# Altium footprint library Opencore_PCB_Lib.PcbLib: 39 footprints (part 1 of 3)
Each footprint in its own frame and in the unit in brackets; x right, y up, seen from the top. Pads: shape width x height; smd on the part's side, far side on the other; paste and mask are expansions set on the pad; w line width, h text height; cw(c..) or ccw(c..) is an arc to the next point about the centre after c.
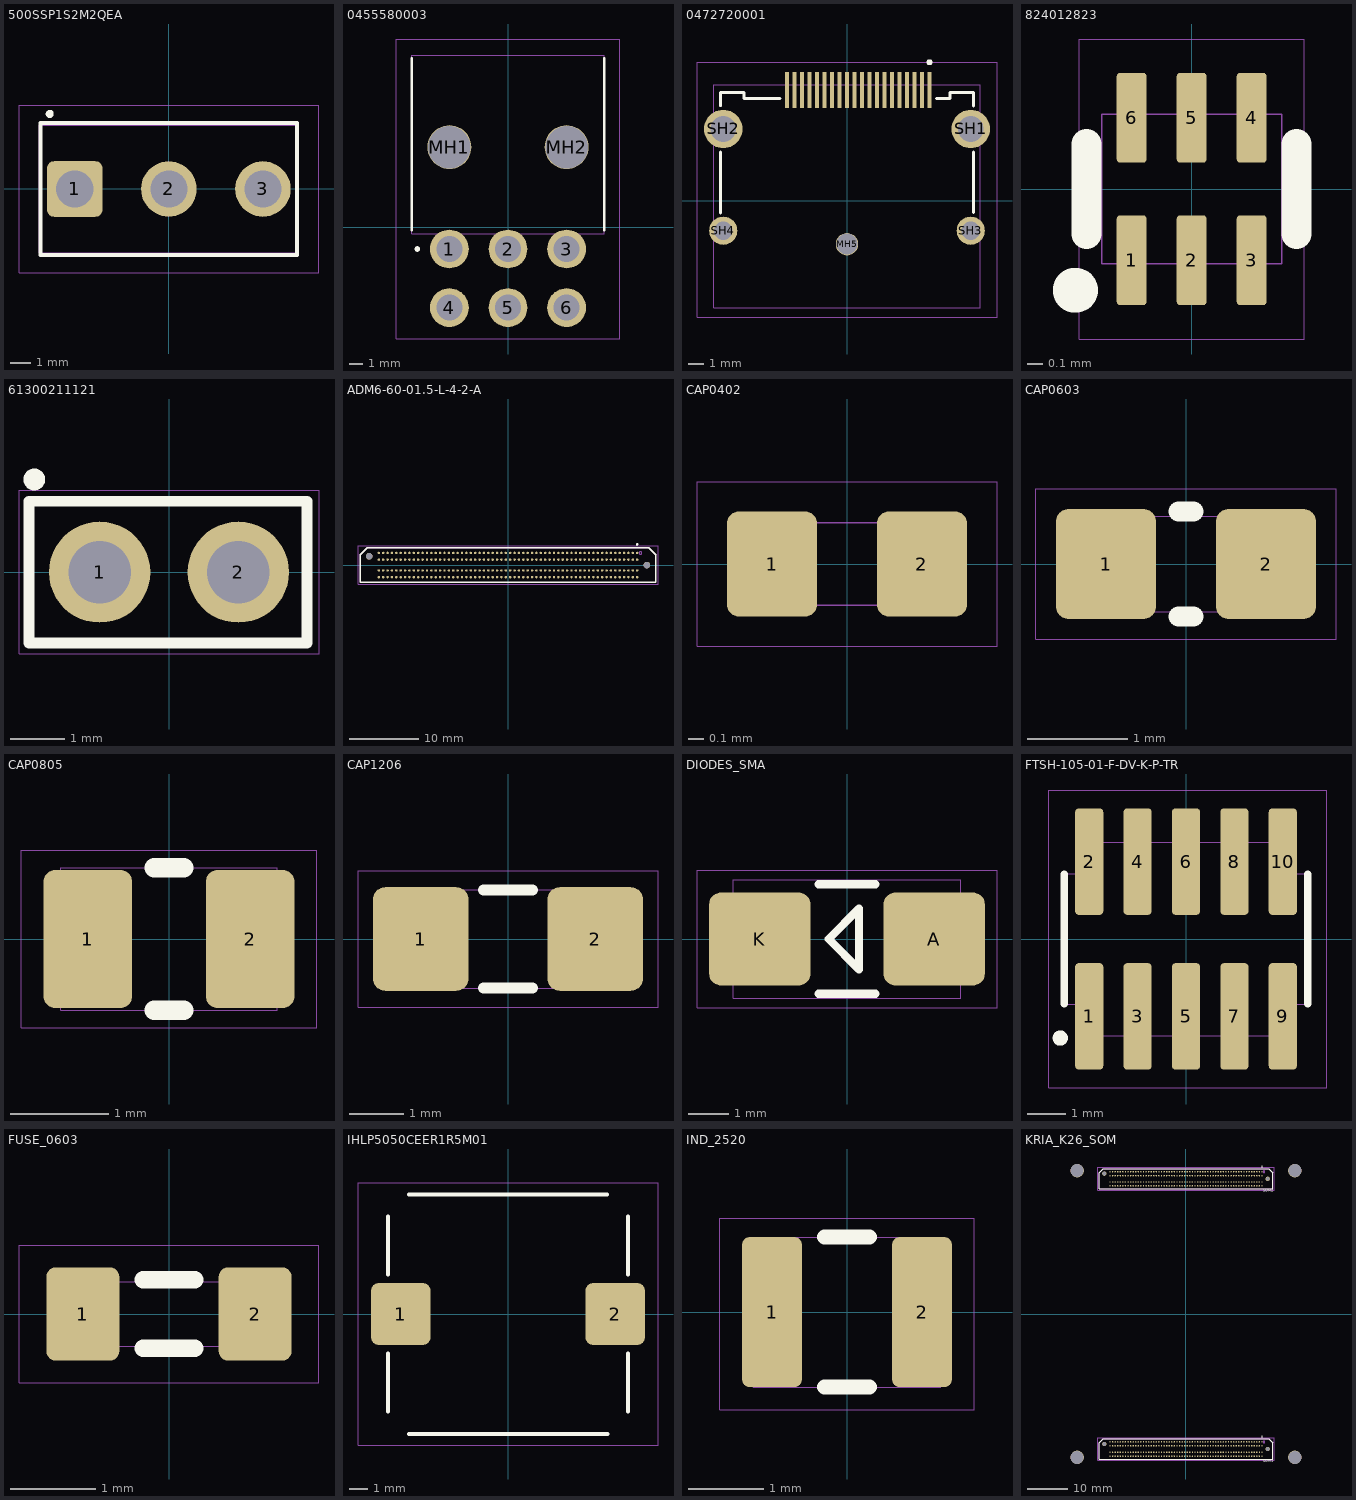
[diagram p0: the footprints below, top view; thin cyan lines are the x and y axes]

## 500SSP1S2M2QEA [mm]
pads (3):
  rrect25% 2.775x2.775 hole 1.85: 1(-4.7,0)
  round 2.775 hole 1.85: 2(0,0) 3(4.7,0)
Top Overlay:
  circle w0.2: c-5.95,3.75 r0.1
  lines w0.2: -6.4,-3.3 -6.4,3.3 6.4,3.3 6.4,-3.3 -6.4,-3.3
Top Component Outline:
  lines w0.01: -6.485,-3.175 6.485,-3.175 6.485,3.175 -6.485,3.175 -6.485,-3.175
Top Designator (Mech11):
  text ".Designator" at -3.647,-0.357 h1
Top Courtyard:
  lines w0.001: -7.485,-4.175 -7.485,4.175 7.5,4.175 7.5,-4.175 -7.485,-4.175
3D body "500SSP1S2M2QEA.stp": height 16.19, standoff -4, extent -6.34,-3.3 6.36,3.3

## 0455580003 [mm]
pads (8):
  round 2.775 hole 1.85: 1(-4.2,-1.55) 2(0,-1.55) 3(4.2,-1.55) 4(-4.2,-5.75) 5(0,-5.75) 6(4.2,-5.75)
  round 3.15 hole 3.05 unplated: MH1(-4.2,5.75) MH2(4.2,5.75)
Top Overlay:
  circle w0.2: c-6.5,-1.55 r0.1
  lines w0.2: -6.9,-0.2 -6.9,12.1 ; 6.9,-0.2 6.9,12.1
Top Component Outline:
  lines w0.01: -6.9,-0.45 6.9,-0.45 6.9,12.35 -6.9,12.35 -6.9,-0.45
Top Designator (Mech11):
  text ".Designator" at -3.647,-0.357 h1
Top Courtyard:
  lines w0.001: -8,-8 -8,13.5 8,13.5 8,-8 -8,-8
3D body "0455580003.stp": height 10.1, standoff -5, extent -6.9,-6.569 6.9,12.35

## 0472720001 [mm]
pads (25):
  rrect25% 0.28x2.4 smd mask+0.05: 1(5.5,7.4) 2(5,7.4) 3(4.5,7.4) 4(4,7.4) 5(3.5,7.4) 6(3,7.4) 7(2.5,7.4) 8(2,7.4) 9(1.5,7.4) 10(1,7.4) 11(0.5,7.4) 12(0,7.4) 13(-0.5,7.4) 14(-1,7.4) 15(-1.5,7.4) 16(-2,7.4) 17(-2.5,7.4) 18(-3,7.4) 19(-3.5,7.4) 20(-4,7.4)
  round 1.5 hole 1.4 unplated: MH5(0,-2.88)
  round 2.565 hole 1.71: SH1(8.25,4.8) SH2(-8.25,4.8)
  round 1.875 hole 1.25: SH3(8.25,-1.98) SH4(-8.25,-1.98)
Top Overlay:
  circle w0.2: c5.5,9.25 r0.1
  lines w0.2: -8.425,-0.8 -8.425,3.25 ; -8.425,6.35 -8.425,7.225 -6.875,7.225 -6.875,6.85 -4.45,6.85 ; 5.95,6.837 6.875,6.837 6.875,7.225 8.431,7.225 8.431,6.337 ; 8.425,-0.775 8.425,3.275
Top Component Outline:
  lines w0.01: -8.9,-7.13 -8.9,7.761 8.888,7.761 8.888,-7.13 -8.9,-7.13
Top Designator (Mech11):
  text ".Designator" at -3.647,-0.382 h1
Top Courtyard:
  lines w0.001: -10,-7.75 -10,9.25 10,9.25 10,-7.75 -10,-7.75
3D body "0472720001.stp": height 6.63, standoff -2.12, extent -8.895,-7.13 8.89,7.76

## 824012823 [mm]
pads (6):
  rrect25% 0.2x0.6 smd mask+0.05: 1(-0.4,-0.475) 2(0,-0.475) 3(0.4,-0.475) 4(0.4,0.475) 5(0,0.475) 6(-0.4,0.475)
Top Overlay:
  circle w0.2: c-0.775,-0.675 r0.05
  lines w0.2: -0.7,-0.3 -0.7,0.3 ; 0.7,-0.3 0.7,0.3
Top Component Outline:
  lines w0.01: -0.6,-0.5 -0.6,0.5 0.6,0.5 0.6,-0.5 -0.6,-0.5
Top Designator (Mech11):
  text ".Designator" at 0.107,-1.094 h0.3
Top Courtyard:
  lines w0.001: -0.75,-1 0.75,-1 0.75,1 -0.75,1 -0.75,-1
3D body "824012823.stp": height 0.45, standoff 0, extent -0.6,-0.5 0.6,0.5

## 61300211121 [mm] "CONN HEADER VERT 2POS 2.54MM"
pads (2):
  oval 1.86x1.85 hole 1.15: 1(-1.27,0) 2(1.27,0)
Top Overlay:
  circle w0.2: c-2.47,1.7 r0.1
  lines w0.2: -2.57,-1.3 2.53,-1.3 2.53,1.3 -2.57,1.3 -2.57,-1.3
Top Designator (Mech11):
  text ".Designator" at -2.735,-0.268 h0.75
Top Courtyard:
  lines w0.01: -2.75,-1.5 -2.75,1.5 2.75,1.5 2.75,-1.5 -2.75,-1.5
3D body "Wurth_61300211121.stp": height 8.55, standoff -2.99, extent -2.54,-1.27 2.54,1.27

## ADM6-60-01.5-L-4-2-A [mm] "SAMTEC CONN 0.635MM HDR 60POS SMD"
height 4.1
pads (242):
  round 0.356 smd: A1(18.733,1.75) A2(18.098,1.75) A3(17.463,1.75) A4(16.828,1.75) A5(16.193,1.75) A6(15.558,1.75) A7(14.923,1.75) A8(14.288,1.75) A9(13.653,1.75) A10(13.018,1.75) A11(12.383,1.75) A12(11.748,1.75) A13(11.113,1.75) A14(10.478,1.75) A15(9.843,1.75) A16(9.208,1.75) A17(8.573,1.75) A18(7.938,1.75) A19(7.303,1.75) A20(6.668,1.75) A21(6.033,1.75) A22(5.398,1.75) A23(4.763,1.75) A24(4.128,1.75) A25(3.493,1.75) A26(2.858,1.75) A27(2.223,1.75) A28(1.588,1.75) A29(0.953,1.75) A30(0.318,1.75) A31(-0.317,1.75) A32(-0.952,1.75) A33(-1.587,1.75) A34(-2.222,1.75) A35(-2.857,1.75) A36(-3.492,1.75) A37(-4.127,1.75) A38(-4.762,1.75) A39(-5.397,1.75) A40(-6.032,1.75) A41(-6.667,1.75) A42(-7.302,1.75) A43(-7.937,1.75) A44(-8.572,1.75) A45(-9.207,1.75) A46(-9.842,1.75) A47(-10.477,1.75) A48(-11.112,1.75) A49(-11.747,1.75) A50(-12.382,1.75) A51(-13.017,1.75) A52(-13.652,1.75) A53(-14.287,1.75) A54(-14.922,1.75) A55(-15.557,1.75) A56(-16.192,1.75) A57(-16.827,1.75) A58(-17.462,1.75) A59(-18.097,1.75) A60(-18.732,1.75) B1(18.733,0.79) B2(18.098,0.79) B3(17.463,0.79) B4(16.828,0.79) B5(16.193,0.79) B6(15.558,0.79) B7(14.923,0.79) B8(14.288,0.79) B9(13.653,0.79) B10(13.018,0.79) B11(12.383,0.79) B12(11.748,0.79) B13(11.113,0.79) B14(10.478,0.79) B15(9.843,0.79) B16(9.208,0.79) B17(8.573,0.79) B18(7.938,0.79) B19(7.303,0.79) B20(6.668,0.79) B21(6.033,0.79) B22(5.398,0.79) B23(4.763,0.79) B24(4.128,0.79) B25(3.493,0.79) B26(2.858,0.79) B27(2.223,0.79) B28(1.588,0.79) B29(0.953,0.79) B30(0.318,0.79) B31(-0.317,0.79) B32(-0.952,0.79) B33(-1.587,0.79) B34(-2.222,0.79) B35(-2.857,0.79) B36(-3.492,0.79) B37(-4.127,0.79) B38(-4.762,0.79) B39(-5.397,0.79) B40(-6.032,0.79) B41(-6.667,0.79) B42(-7.302,0.79) B43(-7.937,0.79) B44(-8.572,0.79) B45(-9.207,0.79) B46(-9.842,0.79) B47(-10.477,0.79) B48(-11.112,0.79) B49(-11.747,0.79) B50(-12.382,0.79) B51(-13.017,0.79) B52(-13.652,0.79) B53(-14.287,0.79) B54(-14.922,0.79) B55(-15.557,0.79) B56(-16.192,0.79) B57(-16.827,0.79) B58(-17.462,0.79) B59(-18.097,0.79) B60(-18.732,0.79) C1(18.733,-0.79) C2(18.098,-0.79) C3(17.463,-0.79) C4(16.828,-0.79) C5(16.193,-0.79) C6(15.558,-0.79) C7(14.923,-0.79) C8(14.288,-0.79) C9(13.653,-0.79) C10(13.018,-0.79) C11(12.383,-0.79) C12(11.748,-0.79) C13(11.113,-0.79) C14(10.478,-0.79) C15(9.843,-0.79) C16(9.208,-0.79) C17(8.573,-0.79) C18(7.938,-0.79) C19(7.303,-0.79) C20(6.668,-0.79) C21(6.033,-0.79) C22(5.398,-0.79) C23(4.763,-0.79) C24(4.128,-0.79) C25(3.493,-0.79) C26(2.858,-0.79) C27(2.223,-0.79) C28(1.588,-0.79) C29(0.953,-0.79) C30(0.318,-0.79) C31(-0.317,-0.79) C32(-0.952,-0.79) C33(-1.587,-0.79) C34(-2.222,-0.79) C35(-2.857,-0.79) C36(-3.492,-0.79) C37(-4.127,-0.79) C38(-4.762,-0.79) C39(-5.397,-0.79) C40(-6.032,-0.79) C41(-6.667,-0.79) C42(-7.302,-0.79) C43(-7.937,-0.79) C44(-8.572,-0.79) C45(-9.207,-0.79) C46(-9.842,-0.79) C47(-10.477,-0.79) C48(-11.112,-0.79) C49(-11.747,-0.79) C50(-12.382,-0.79) C51(-13.017,-0.79) C52(-13.652,-0.79) C53(-14.287,-0.79) C54(-14.922,-0.79) C55(-15.557,-0.79) C56(-16.192,-0.79) C57(-16.827,-0.79) C58(-17.462,-0.79) C59(-18.097,-0.79) C60(-18.732,-0.79) D1(18.733,-1.75) D2(18.098,-1.75) D3(17.463,-1.75) D4(16.828,-1.75) D5(16.193,-1.75) D6(15.558,-1.75) D7(14.923,-1.75) D8(14.288,-1.75) D9(13.653,-1.75) D10(13.018,-1.75) D11(12.383,-1.75) D12(11.748,-1.75) D13(11.113,-1.75) D14(10.478,-1.75) D15(9.843,-1.75) D16(9.208,-1.75) D17(8.573,-1.75) D18(7.938,-1.75) D19(7.303,-1.75) D20(6.668,-1.75) D21(6.033,-1.75) D22(5.398,-1.75) D23(4.763,-1.75) D24(4.128,-1.75) D25(3.493,-1.75) D26(2.858,-1.75) D27(2.223,-1.75) D28(1.588,-1.75) D29(0.953,-1.75) D30(0.318,-1.75) D31(-0.317,-1.75) D32(-0.952,-1.75) D33(-1.587,-1.75) D34(-2.222,-1.75) D35(-2.857,-1.75) D36(-3.492,-1.75) D37(-4.127,-1.75) D38(-4.762,-1.75) D39(-5.397,-1.75) D40(-6.032,-1.75) D41(-6.667,-1.75) D42(-7.302,-1.75) D43(-7.937,-1.75) D44(-8.572,-1.75) D45(-9.207,-1.75) D46(-9.842,-1.75) D47(-10.477,-1.75) D48(-11.112,-1.75) D49(-11.747,-1.75) D50(-12.382,-1.75) D51(-13.017,-1.75) D52(-13.652,-1.75) D53(-14.287,-1.75) D54(-14.922,-1.75) D55(-15.557,-1.75) D56(-16.192,-1.75) D57(-16.827,-1.75) D58(-17.462,-1.75) D59(-18.097,-1.75) D60(-18.732,-1.75)
  round 0.95 hole 0.95: SH1(20.135,0) SH2(-20.135,1.27)
Top Overlay:
  circle w0.2: c18.733,3 r0.1
  lines w0.2: -21.41,-2.5 21.41,-2.5 21.41,1.49 20.4,2.5 -20.4,2.5 -21.41,1.49 -21.41,-2.5
Top Component Outline:
  circle w0.01: c19.225,1.75 r0.2
  lines w0.01: 21.41,-2.5 -21.411,-2.5 -21.411,1.489 -20.4,2.5 20.4,2.5 21.41,1.49 21.41,-2.5 ; 21.41,-2.5 21.41,-2.5 ; 21.41,-2.5 21.41,-2.5
Top Designator (Mech11):
  text ".Designator" at -3.647,-0.357 h1
Top Courtyard:
  lines w0.001: -21.75,-2.8 -21.75,2.8 21.75,2.8 21.75,-2.8 -21.75,-2.8
3D body "ADM6-60-01.5-L-4-2-A-TR--3DModel-STEP-269445.STEP": height 4.03, standoff -0.74, extent -21.41,-2.5 21.41,2.5

## CAP0402 [mm] "Chip Capacitor, Body 1x0.5mm, Height 0.35mm, IPC Medium Density"
pads (2):
  rrect25% 0.6x0.7 smd: 1(-0.5,0) 2(0.5,0)
Top Component Outline:
  lines w0.01: -0.525,-0.275 -0.525,0.275 0.525,0.275 0.525,-0.275 -0.525,-0.275
Top Designator (Mech11):
  text ".Designator" at -1.459,-0.143 h0.4
Top Courtyard:
  lines w0.001: -1,-0.55 -1,0.55 1,0.55 1,-0.55 -1,-0.55
3D body "CAP0402.stp": height 0.54, standoff -0.01, extent -0.525,-0.275 0.525,0.275

## CAP0603 [mm]
height 0.55
pads (2):
  rrect25% 1x1.1 smd: 1(-0.8,0) 2(0.8,0)
Top Overlay:
  lines w0.2: -0.075,-0.525 0.075,-0.525 ; -0.075,0.525 0.075,0.525
Top Component Outline:
  lines w0.01: -0.875,-0.475 0.875,-0.475 0.875,0.475 -0.875,0.475 -0.875,-0.475
Top Designator (Mech11):
  text ".Designator" at -1.823,-0.179 h0.5
Top Courtyard:
  lines w0.001: -1.5,-0.75 -1.5,0.75 1.5,0.75 1.5,-0.75 -1.5,-0.75
3D body "c0603c101j1gactu.stp": height 0.87, standoff 0, extent -0.875,-0.475 0.875,0.475

## CAP0805 [mm] "Chip Capacitor, Body 2.0x1.2mm, Height 0.45mm, IPC Medium Density"
pads (2):
  rrect25% 0.9x1.4 smd: 1(-0.825,0) 2(0.825,0)
Top Overlay:
  lines w0.2: -0.15,-0.725 0.15,-0.725 ; -0.15,0.725 0.15,0.725
Top Component Outline:
  lines w0.01: -1.1,-0.725 -1.1,0.725 1.1,0.725 1.1,-0.725 -1.1,-0.725
Top Designator (Mech11):
  text ".Designator" at -1.823,-0.179 h0.5
Top Courtyard:
  lines w0.001: -1.5,-0.9 1.5,-0.9 1.5,0.9 -1.5,0.9 -1.5,-0.9
3D body "CAP0805.stp": height 1.39, standoff -0.01, extent -1.1,-0.725 1.1,0.725

## CAP1206 [mm] "Chip Capacitor, Body 3.2x1.6mm, Height 0.55mm, IPC Medium Density"
height 0.55
pads (2):
  rrect25% 1.75x1.9 smd: 1(-1.6,0) 2(1.6,0)
Top Overlay:
  lines w0.2: -0.45,-0.9 0.45,-0.9 ; -0.45,0.9 0.45,0.9
Top Component Outline:
  lines w0.01: -1.7,-0.9 1.7,-0.9 1.7,0.9 -1.7,0.9 -1.7,-0.9
Top Designator (Mech11):
  text ".Designator" at -2.735,-0.268 h0.75
Top Courtyard:
  lines w0.001: -2.75,-1.25 2.75,-1.25 2.75,1.25 -2.75,1.25 -2.75,-1.25
3D body "1206.stp": height 0.88, standoff 0, extent -1.7,-0.9 1.7,0.9

## DIODES_SMA [mm]
pads (2):
  rrect25% 2.5x2.3 smd: A(2.15,0) K(-2.15,0)
Top Overlay:
  lines w0.2: -0.7,-1.35 0.7,-1.35 ; -0.7,1.35 0.7,1.35 ; -0.45,0 0.3,0.75 0.3,-0.75 -0.45,0 ; -0.45,0 -0.45,0
Top Component Outline:
  lines w0.01: -0.45,0 0.3,-0.75 0.3,0.75 -0.45,0 ; -0.45,0 -0.45,0 ; -2.8,-1.458 -2.8,1.458 2.8,1.458 2.8,-1.458 -2.8,-1.458
Top Designator (Mech11):
  text ".Designator" at -3.647,-0.357 h1
Top Courtyard:
  lines w0.001: -3.7,-1.7 3.7,-1.7 3.7,1.7 -3.7,1.7 -3.7,-1.7
3D body "SMA_DIO.step": height 2.35, standoff 0, extent -2.795,-1.46 2.795,1.46

## FTSH-105-01-F-DV-K-P-TR [mil] "Samtec programming header 10 positions"
pads (10):
  rrect25% 29x110 smd: 1(-100,-80) 2(-100,80) 3(-50,-80) 4(-50,80) 5(0,-80) 6(0,80) 7(50,-80) 8(50,80) 9(100,-80) 10(100,80)
Top Overlay:
  circle w7.87: c-129.92,-102.36 r3.94
  lines w7.87: -125.98,-66.93 -125.98,66.93 ; 125.98,-66.93 125.98,66.93
Top Component Outline:
  lines w0.39: -125,-67.5 -100,-67.5 -100,-100 100,-100 100,-67.5 125,-67.5 125,67.5 100,67.5 100,100 -100,100 -100,67.5 -125,67.5 -125,-67.5
Top Designator (Mech11):
  text ".Designator" at -143.58,-14.06 h39.37
Top Courtyard:
  lines w0.04: -141.73,-153.54 -141.73,153.54 145.67,153.54 145.67,-153.54 -141.73,-153.54
3D body "FTSH-105-01-F-DV-K-P-TR.stp": height 275.5, standoff 0.5, extent -125.01,-175.01 124.99,114.99

## FUSE_0603 [mm] "Chip Fuse, Body 1.6x0.81mm"
height 0.305
pads (2):
  rrect25% 0.85x1.09 smd: 1(-1.005,0) 2(1.005,0)
Top Overlay:
  lines w0.2: -0.3,-0.4 0.3,-0.4 ; -0.3,0.4 0.3,0.4
Top Component Outline:
  lines w0.01: -0.8,-0.375 0.8,-0.375 0.8,0.375 -0.8,0.375 -0.8,-0.375
Top Designator (Mech11):
  text ".Designator" at -1.823,-0.179 h0.5
Top Courtyard:
  lines w0.001: -1.75,-0.8 -1.75,0.8 1.75,0.8 1.75,-0.8 -1.75,-0.8
3D body "User Library-ptc06032-1.STEP": height 0.75, standoff 0, extent -0.8,-0.375 0.8,0.375

## IHLP5050CEER1R5M01 [mm] "Vishay Dale Inductor - 13.2mm x 12.9mm"
pads (2):
  rrect25% 3.175x3.3 smd: 1(-5.715,0) 2(5.715,0)
Top Overlay:
  lines w0.2: -6.4,-5.2 -6.4,-2.1 ; -6.4,2.1 -6.4,5.2 ; -5.3,6.375 5.3,6.375 ; -5.281,-6.399 5.319,-6.399 ; 6.4,-5.2 6.4,-2.1 ; 6.4,2.1 6.4,5.2
Top Designator (Mech11):
  text ".Designator" at -3.647,-0.357 h1
Top Courtyard:
  lines w0.001: -8,-7 8,-7 8,7 -8,7 -8,-7
3D body "IHLP5050CE (0.68-10uH).STEP": height 3.4, standoff 0.01, extent -6.577,-6.386 6.585,6.37

## IND_2520 [mm]
height 1.2
pads (2):
  rrect25% 0.8x2 smd: 1(-1,0) 2(1,0)
Top Overlay:
  lines w0.2: -0.3,-1 0.3,-1 ; -0.3,1 0.3,1
Top Component Outline:
  lines w0.01: -1.25,-1 1.25,-1 1.25,1 -1.25,1 -1.25,-1
Top Designator (Mech11):
  text ".Designator" at -1.459,-0.143 h0.4
Top Courtyard:
  lines w0.001: -1.7,-1.3 1.7,-1.3 1.7,1.25 -1.7,1.25 -1.7,-1.3
3D body "DFE252012F-1R0M_3DP2.STEP": height 1.21, standoff 0.01, extent -1.25,-1 1.25,1

## KRIA_K26_SOM [mil]
pads (488):
  round 14.02 smd mask+1.97: S1_A1(737.5,-1241.61) S1_A2(712.5,-1241.61) S1_A3(687.5,-1241.61) S1_A4(662.5,-1241.61) S1_A5(637.5,-1241.61) S1_A6(612.5,-1241.61) S1_A7(587.5,-1241.61) S1_A8(562.5,-1241.61) S1_A9(537.5,-1241.61) S1_A10(512.5,-1241.61) S1_A11(487.5,-1241.61) S1_A12(462.5,-1241.61) S1_A13(437.5,-1241.61) S1_A14(412.5,-1241.61) S1_A15(387.5,-1241.61) S1_A16(362.5,-1241.61) S1_A17(337.5,-1241.61) S1_A18(312.5,-1241.61) S1_A19(287.5,-1241.61) S1_A20(262.5,-1241.61) S1_A21(237.5,-1241.61) S1_A22(212.5,-1241.61) S1_A23(187.5,-1241.61) S1_A24(162.5,-1241.61) S1_A25(137.5,-1241.61) S1_A26(112.5,-1241.61) S1_A27(87.5,-1241.61) S1_A28(62.5,-1241.61) S1_A29(37.5,-1241.61) S1_A30(12.5,-1241.61) S1_A31(-12.5,-1241.61) S1_A32(-37.5,-1241.61) S1_A33(-62.5,-1241.61) S1_A34(-87.5,-1241.61) S1_A35(-112.5,-1241.61) S1_A36(-137.5,-1241.61) S1_A37(-162.5,-1241.61) S1_A38(-187.5,-1241.61) S1_A39(-212.5,-1241.61) S1_A40(-237.5,-1241.61) S1_A41(-262.5,-1241.61) S1_A42(-287.5,-1241.61) S1_A43(-312.5,-1241.61) S1_A44(-337.5,-1241.61) S1_A45(-362.5,-1241.61) S1_A46(-387.5,-1241.61) S1_A47(-412.5,-1241.61) S1_A48(-437.5,-1241.61) S1_A49(-462.5,-1241.61) S1_A50(-487.5,-1241.61) S1_A51(-512.5,-1241.61) S1_A52(-537.5,-1241.61) S1_A53(-562.5,-1241.61) S1_A54(-587.5,-1241.61) S1_A55(-612.5,-1241.61) S1_A56(-637.5,-1241.61) S1_A57(-662.5,-1241.61) S1_A58(-687.5,-1241.61) S1_A59(-712.5,-1241.61) S1_A60(-737.5,-1241.61) S1_B1(737.5,-1279.41) S1_B2(712.5,-1279.41) S1_B3(687.5,-1279.41) S1_B4(662.5,-1279.41) S1_B5(637.5,-1279.41) S1_B6(612.5,-1279.41) S1_B7(587.5,-1279.41) S1_B8(562.5,-1279.41) S1_B9(537.5,-1279.41) S1_B10(512.5,-1279.41) S1_B11(487.5,-1279.41) S1_B12(462.5,-1279.41) S1_B13(437.5,-1279.41) S1_B14(412.5,-1279.41) S1_B15(387.5,-1279.41) S1_B16(362.5,-1279.41) S1_B17(337.5,-1279.41) S1_B18(312.5,-1279.41) S1_B19(287.5,-1279.41) S1_B20(262.5,-1279.41) S1_B21(237.5,-1279.41) S1_B22(212.5,-1279.41) S1_B23(187.5,-1279.41) S1_B24(162.5,-1279.41) S1_B25(137.5,-1279.41) S1_B26(112.5,-1279.41) S1_B27(87.5,-1279.41) S1_B28(62.5,-1279.41) S1_B29(37.5,-1279.41) S1_B30(12.5,-1279.41) S1_B31(-12.5,-1279.41) S1_B32(-37.5,-1279.41) S1_B33(-62.5,-1279.41) S1_B34(-87.5,-1279.41) S1_B35(-112.5,-1279.41) S1_B36(-137.5,-1279.41) S1_B37(-162.5,-1279.41) S1_B38(-187.5,-1279.41) S1_B39(-212.5,-1279.41) S1_B40(-237.5,-1279.41) S1_B41(-262.5,-1279.41) S1_B42(-287.5,-1279.41) S1_B43(-312.5,-1279.41) S1_B44(-337.5,-1279.41) S1_B45(-362.5,-1279.41) S1_B46(-387.5,-1279.41) S1_B47(-412.5,-1279.41) S1_B48(-437.5,-1279.41) S1_B49(-462.5,-1279.41) S1_B50(-487.5,-1279.41) S1_B51(-512.5,-1279.41) S1_B52(-537.5,-1279.41) S1_B53(-562.5,-1279.41) S1_B54(-587.5,-1279.41) S1_B55(-612.5,-1279.41) S1_B56(-637.5,-1279.41) S1_B57(-662.5,-1279.41) S1_B58(-687.5,-1279.41) S1_B59(-712.5,-1279.41) S1_B60(-737.5,-1279.41) S1_C1(737.5,-1341.61) S1_C2(712.5,-1341.61) S1_C3(687.5,-1341.61) S1_C4(662.5,-1341.61) S1_C5(637.5,-1341.61) S1_C6(612.5,-1341.61) S1_C7(587.5,-1341.61) S1_C8(562.5,-1341.61) S1_C9(537.5,-1341.61) S1_C10(512.5,-1341.61) S1_C11(487.5,-1341.61) S1_C12(462.5,-1341.61) S1_C13(437.5,-1341.61) S1_C14(412.5,-1341.61) S1_C15(387.5,-1341.61) S1_C16(362.5,-1341.61) S1_C17(337.5,-1341.61) S1_C18(312.5,-1341.61) S1_C19(287.5,-1341.61) S1_C20(262.5,-1341.61) S1_C21(237.5,-1341.61) S1_C22(212.5,-1341.61) S1_C23(187.5,-1341.61) S1_C24(162.5,-1341.61) S1_C25(137.5,-1341.61) S1_C26(112.5,-1341.61) S1_C27(87.5,-1341.61) S1_C28(62.5,-1341.61) S1_C29(37.5,-1341.61) S1_C30(12.5,-1341.61) S1_C31(-12.5,-1341.61) S1_C32(-37.5,-1341.61) S1_C33(-62.5,-1341.61) S1_C34(-87.5,-1341.61) S1_C35(-112.5,-1341.61) S1_C36(-137.5,-1341.61) S1_C37(-162.5,-1341.61) S1_C38(-187.5,-1341.61) S1_C39(-212.5,-1341.61) S1_C40(-237.5,-1341.61) S1_C41(-262.5,-1341.61) S1_C42(-287.5,-1341.61) S1_C43(-312.5,-1341.61) S1_C44(-337.5,-1341.61) S1_C45(-362.5,-1341.61) S1_C46(-387.5,-1341.61) S1_C47(-412.5,-1341.61) S1_C48(-437.5,-1341.61) S1_C49(-462.5,-1341.61) S1_C50(-487.5,-1341.61) S1_C51(-512.5,-1341.61) S1_C52(-537.5,-1341.61) S1_C53(-562.5,-1341.61) S1_C54(-587.5,-1341.61) S1_C55(-612.5,-1341.61) S1_C56(-637.5,-1341.61) S1_C57(-662.5,-1341.61) S1_C58(-687.5,-1341.61) S1_C59(-712.5,-1341.61) S1_C60(-737.5,-1341.61) S1_D1(737.5,-1379.41) S1_D2(712.5,-1379.41) S1_D3(687.5,-1379.41) S1_D4(662.5,-1379.41) S1_D5(637.5,-1379.41) S1_D6(612.5,-1379.41) S1_D7(587.5,-1379.41) S1_D8(562.5,-1379.41) S1_D9(537.5,-1379.41) S1_D10(512.5,-1379.41) S1_D11(487.5,-1379.41) S1_D12(462.5,-1379.41) S1_D13(437.5,-1379.41) S1_D14(412.5,-1379.41) S1_D15(387.5,-1379.41) S1_D16(362.5,-1379.41) S1_D17(337.5,-1379.41) S1_D18(312.5,-1379.41) S1_D19(287.5,-1379.41) S1_D20(262.5,-1379.41) S1_D21(237.5,-1379.41) S1_D22(212.5,-1379.41) S1_D23(187.5,-1379.41) S1_D24(162.5,-1379.41) S1_D25(137.5,-1379.41) S1_D26(112.5,-1379.41) S1_D27(87.5,-1379.41) S1_D28(62.5,-1379.41) S1_D29(37.5,-1379.41) S1_D30(12.5,-1379.41) S1_D31(-12.5,-1379.41) S1_D32(-37.5,-1379.41) S1_D33(-62.5,-1379.41) S1_D34(-87.5,-1379.41) S1_D35(-112.5,-1379.41) S1_D36(-137.5,-1379.41) S1_D37(-162.5,-1379.41) S1_D38(-187.5,-1379.41) S1_D39(-212.5,-1379.41) S1_D40(-237.5,-1379.41) S1_D41(-262.5,-1379.41) S1_D42(-287.5,-1379.41) S1_D43(-312.5,-1379.41) S1_D44(-337.5,-1379.41) S1_D45(-362.5,-1379.41) S1_D46(-387.5,-1379.41) S1_D47(-412.5,-1379.41) S1_D48(-437.5,-1379.41) S1_D49(-462.5,-1379.41) S1_D50(-487.5,-1379.41) S1_D51(-512.5,-1379.41) S1_D52(-537.5,-1379.41) S1_D53(-562.5,-1379.41) S1_D54(-587.5,-1379.41) S1_D55(-612.5,-1379.41) S1_D56(-637.5,-1379.41) S1_D57(-662.5,-1379.41) S1_D58(-687.5,-1379.41) S1_D59(-712.5,-1379.41) S1_D60(-737.5,-1379.41) S2_A1(737.5,1380.91) S2_A2(712.5,1380.91) S2_A3(687.5,1380.91) S2_A4(662.5,1380.91) S2_A5(637.5,1380.91) S2_A6(612.5,1380.91) S2_A7(587.5,1380.91) S2_A8(562.5,1380.91) S2_A9(537.5,1380.91) S2_A10(512.5,1380.91) S2_A11(487.5,1380.91) S2_A12(462.5,1380.91) S2_A13(437.5,1380.91) S2_A14(412.5,1380.91) S2_A15(387.5,1380.91) S2_A16(362.5,1380.91) S2_A17(337.5,1380.91) S2_A18(312.5,1380.91) S2_A19(287.5,1380.91) S2_A20(262.5,1380.91) S2_A21(237.5,1380.91) S2_A22(212.5,1380.91) S2_A23(187.5,1380.91) S2_A24(162.5,1380.91) S2_A25(137.5,1380.91) S2_A26(112.5,1380.91) S2_A27(87.5,1380.91) S2_A28(62.5,1380.91) S2_A29(37.5,1380.91) S2_A30(12.5,1380.91) S2_A31(-12.5,1380.91) S2_A32(-37.5,1380.91) S2_A33(-62.5,1380.91) S2_A34(-87.5,1380.91) S2_A35(-112.5,1380.91) S2_A36(-137.5,1380.91) S2_A37(-162.5,1380.91) S2_A38(-187.5,1380.91) S2_A39(-212.5,1380.91) S2_A40(-237.5,1380.91) S2_A41(-262.5,1380.91) S2_A42(-287.5,1380.91) S2_A43(-312.5,1380.91) S2_A44(-337.5,1380.91) S2_A45(-362.5,1380.91) S2_A46(-387.5,1380.91) S2_A47(-412.5,1380.91) S2_A48(-437.5,1380.91) S2_A49(-462.5,1380.91) S2_A50(-487.5,1380.91) S2_A51(-512.5,1380.91) S2_A52(-537.5,1380.91) S2_A53(-562.5,1380.91) S2_A54(-587.5,1380.91) S2_A55(-612.5,1380.91) S2_A56(-637.5,1380.91) S2_A57(-662.5,1380.91) S2_A58(-687.5,1380.91) S2_A59(-712.5,1380.91) S2_A60(-737.5,1380.91) S2_B1(737.5,1343.11) S2_B2(712.5,1343.11) S2_B3(687.5,1343.11) S2_B4(662.5,1343.11) S2_B5(637.5,1343.11) S2_B6(612.5,1343.11) S2_B7(587.5,1343.11) S2_B8(562.5,1343.11) S2_B9(537.5,1343.11) S2_B10(512.5,1343.11) S2_B11(487.5,1343.11) S2_B12(462.5,1343.11) S2_B13(437.5,1343.11) S2_B14(412.5,1343.11) S2_B15(387.5,1343.11) S2_B16(362.5,1343.11) S2_B17(337.5,1343.11) S2_B18(312.5,1343.11) S2_B19(287.5,1343.11) S2_B20(262.5,1343.11) S2_B21(237.5,1343.11) S2_B22(212.5,1343.11) S2_B23(187.5,1343.11) S2_B24(162.5,1343.11) S2_B25(137.5,1343.11) S2_B26(112.5,1343.11) S2_B27(87.5,1343.11) S2_B28(62.5,1343.11) S2_B29(37.5,1343.11) S2_B30(12.5,1343.11) S2_B31(-12.5,1343.11) S2_B32(-37.5,1343.11) S2_B33(-62.5,1343.11) S2_B34(-87.5,1343.11) S2_B35(-112.5,1343.11) S2_B36(-137.5,1343.11) S2_B37(-162.5,1343.11) S2_B38(-187.5,1343.11) S2_B39(-212.5,1343.11) S2_B40(-237.5,1343.11) S2_B41(-262.5,1343.11) S2_B42(-287.5,1343.11) S2_B43(-312.5,1343.11) S2_B44(-337.5,1343.11) S2_B45(-362.5,1343.11) S2_B46(-387.5,1343.11) S2_B47(-412.5,1343.11) S2_B48(-437.5,1343.11) S2_B49(-462.5,1343.11) S2_B50(-487.5,1343.11) S2_B51(-512.5,1343.11) S2_B52(-537.5,1343.11) S2_B53(-562.5,1343.11) S2_B54(-587.5,1343.11) S2_B55(-612.5,1343.11) S2_B56(-637.5,1343.11) S2_B57(-662.5,1343.11) S2_B58(-687.5,1343.11) S2_B59(-712.5,1343.11) S2_B60(-737.5,1343.11) S2_C1(737.5,1280.91) S2_C2(712.5,1280.91) S2_C3(687.5,1280.91) S2_C4(662.5,1280.91) S2_C5(637.5,1280.91) S2_C6(612.5,1280.91) S2_C7(587.5,1280.91) S2_C8(562.5,1280.91) S2_C9(537.5,1280.91) S2_C10(512.5,1280.91) S2_C11(487.5,1280.91) S2_C12(462.5,1280.91) S2_C13(437.5,1280.91) S2_C14(412.5,1280.91) S2_C15(387.5,1280.91) S2_C16(362.5,1280.91) S2_C17(337.5,1280.91) S2_C18(312.5,1280.91) S2_C19(287.5,1280.91) S2_C20(262.5,1280.91) S2_C21(237.5,1280.91) S2_C22(212.5,1280.91) S2_C23(187.5,1280.91) S2_C24(162.5,1280.91) S2_C25(137.5,1280.91) S2_C26(112.5,1280.91) S2_C27(87.5,1280.91) S2_C28(62.5,1280.91) S2_C29(37.5,1280.91) S2_C30(12.5,1280.91) S2_C31(-12.5,1280.91) S2_C32(-37.5,1280.91) S2_C33(-62.5,1280.91) S2_C34(-87.5,1280.91) S2_C35(-112.5,1280.91) S2_C36(-137.5,1280.91) S2_C37(-162.5,1280.91) S2_C38(-187.5,1280.91) S2_C39(-212.5,1280.91) S2_C40(-237.5,1280.91) S2_C41(-262.5,1280.91) S2_C42(-287.5,1280.91) S2_C43(-312.5,1280.91) S2_C44(-337.5,1280.91) S2_C45(-362.5,1280.91) S2_C46(-387.5,1280.91) S2_C47(-412.5,1280.91) S2_C48(-437.5,1280.91) S2_C49(-462.5,1280.91) S2_C50(-487.5,1280.91) S2_C51(-512.5,1280.91) S2_C52(-537.5,1280.91) S2_C53(-562.5,1280.91) S2_C54(-587.5,1280.91) S2_C55(-612.5,1280.91) S2_C56(-637.5,1280.91) S2_C57(-662.5,1280.91) S2_C58(-687.5,1280.91) S2_C59(-712.5,1280.91) S2_C60(-737.5,1280.91) S2_D1(737.5,1243.11) S2_D2(712.5,1243.11) S2_D3(687.5,1243.11) S2_D4(662.5,1243.11) S2_D5(637.5,1243.11) S2_D6(612.5,1243.11) S2_D7(587.5,1243.11) S2_D8(562.5,1243.11) S2_D9(537.5,1243.11) S2_D10(512.5,1243.11) S2_D11(487.5,1243.11) S2_D12(462.5,1243.11) S2_D13(437.5,1243.11) S2_D14(412.5,1243.11) S2_D15(387.5,1243.11) S2_D16(362.5,1243.11) S2_D17(337.5,1243.11) S2_D18(312.5,1243.11) S2_D19(287.5,1243.11) S2_D20(262.5,1243.11) S2_D21(237.5,1243.11) S2_D22(212.5,1243.11) S2_D23(187.5,1243.11) S2_D24(162.5,1243.11) S2_D25(137.5,1243.11) S2_D26(112.5,1243.11) S2_D27(87.5,1243.11) S2_D28(62.5,1243.11) S2_D29(37.5,1243.11) S2_D30(12.5,1243.11) S2_D31(-12.5,1243.11) S2_D32(-37.5,1243.11) S2_D33(-62.5,1243.11) S2_D34(-87.5,1243.11) S2_D35(-112.5,1243.11) S2_D36(-137.5,1243.11) S2_D37(-162.5,1243.11) S2_D38(-187.5,1243.11) S2_D39(-212.5,1243.11) S2_D40(-237.5,1243.11) S2_D41(-262.5,1243.11) S2_D42(-287.5,1243.11) S2_D43(-312.5,1243.11) S2_D44(-337.5,1243.11) S2_D45(-362.5,1243.11) S2_D46(-387.5,1243.11) S2_D47(-412.5,1243.11) S2_D48(-437.5,1243.11) S2_D49(-462.5,1243.11) S2_D50(-487.5,1243.11) S2_D51(-512.5,1243.11) S2_D52(-537.5,1243.11) S2_D53(-562.5,1243.11) S2_D54(-587.5,1243.11) S2_D55(-612.5,1243.11) S2_D56(-637.5,1243.11) S2_D57(-662.5,1243.11) S2_D58(-687.5,1243.11) S2_D59(-712.5,1243.11) S2_D60(-737.5,1243.11)
  round 41.34 hole 37.4 mask+1.97: S1_SH1(792.72,-1310.51) S1_SH2(-792.72,-1260.51) S2_SH1(792.72,1312.01) S2_SH2(-792.72,1362.01)
  round 129.92 hole 125.98 mask+1.97: ""(-1056.1,-1390.75) ""(-1056.1,1390.75) ""(1056.1,-1390.75) ""(1056.1,1390.75)
Top Overlay:
  circle w7.87: c737.5,1430.12 r3.94
  circle w7.87: c737.5,-1192.4 r3.94
  lines w7.87: -842.91,-1408.94 842.91,-1408.94 842.91,-1251.85 803.15,-1212.09 -803.15,-1212.09 -842.91,-1251.85 -842.91,-1408.94 ; -842.91,1213.58 -842.91,1370.67 -803.15,1410.43 803.15,1410.43 842.91,1370.67 842.91,1213.58 -842.91,1213.58
  text "SOM2" at 748.03,1174.64 h40
  text "SOM1" at 748.03,-1447.88 h40
Top Component Outline:
  circle w0.39: c756.89,1380.91 r7.87
  circle w0.39: c756.89,-1241.61 r7.87
  lines w0.39: 842.92,-1408.92 -842.95,-1408.92 -842.95,-1251.89 -803.15,-1212.09 803.15,-1212.09 842.92,-1251.86 842.92,-1408.92 ; 842.92,-1408.92 842.92,-1408.92 ; 842.92,-1408.92 842.92,-1408.92 ; 842.92,1213.6 842.92,1213.6 ; 842.92,1213.6 842.92,1370.66 803.15,1410.43 -803.15,1410.43 -842.95,1370.63 -842.95,1213.6 842.92,1213.6 ; 842.92,1213.6 842.92,1213.6
Top Designator (Mech11):
  text ".Designator" at -143.58,1297.95 h39.37
  text ".Designator" at -143.58,-1324.57 h39.37
Top Courtyard:
  lines w0.04: -856.3,-1420.75 -856.3,-1200.28 856.3,-1200.28 856.3,-1420.75 -856.3,-1420.75 ; -856.3,1201.77 856.3,1201.77 856.3,1422.24 -856.3,1422.24 -856.3,1201.77
3D body "Kria_K26.stp": height 481.35, standoff 43.24, extent -1181.1,-1515.75 1181.1,1515.75
3D body "ADM6-60-01.5-L-4-2-A-TR--3DModel-STEP-269445.STEP": height 158.77, standoff -29.03, extent -842.91,1213.58 842.91,1410.43
3D body "ADM6-60-01.5-L-4-2-A-TR--3DModel-STEP-269445.STEP": height 158.77, standoff -29.03, extent -842.91,-1408.94 842.91,-1212.09